# Altium footprint library Tomra_Cadstar_Footprints.PcbLib: 373 footprints (part 1 of 24)
Each footprint in its own frame and in the unit in brackets; x right, y up, seen from the top. Pads: shape width x height; smd on the part's side, far side on the other; paste and mask are expansions set on the pad; w line width, h text height; cw(c..) or ccw(c..) is an arc to the next point about the centre after c.
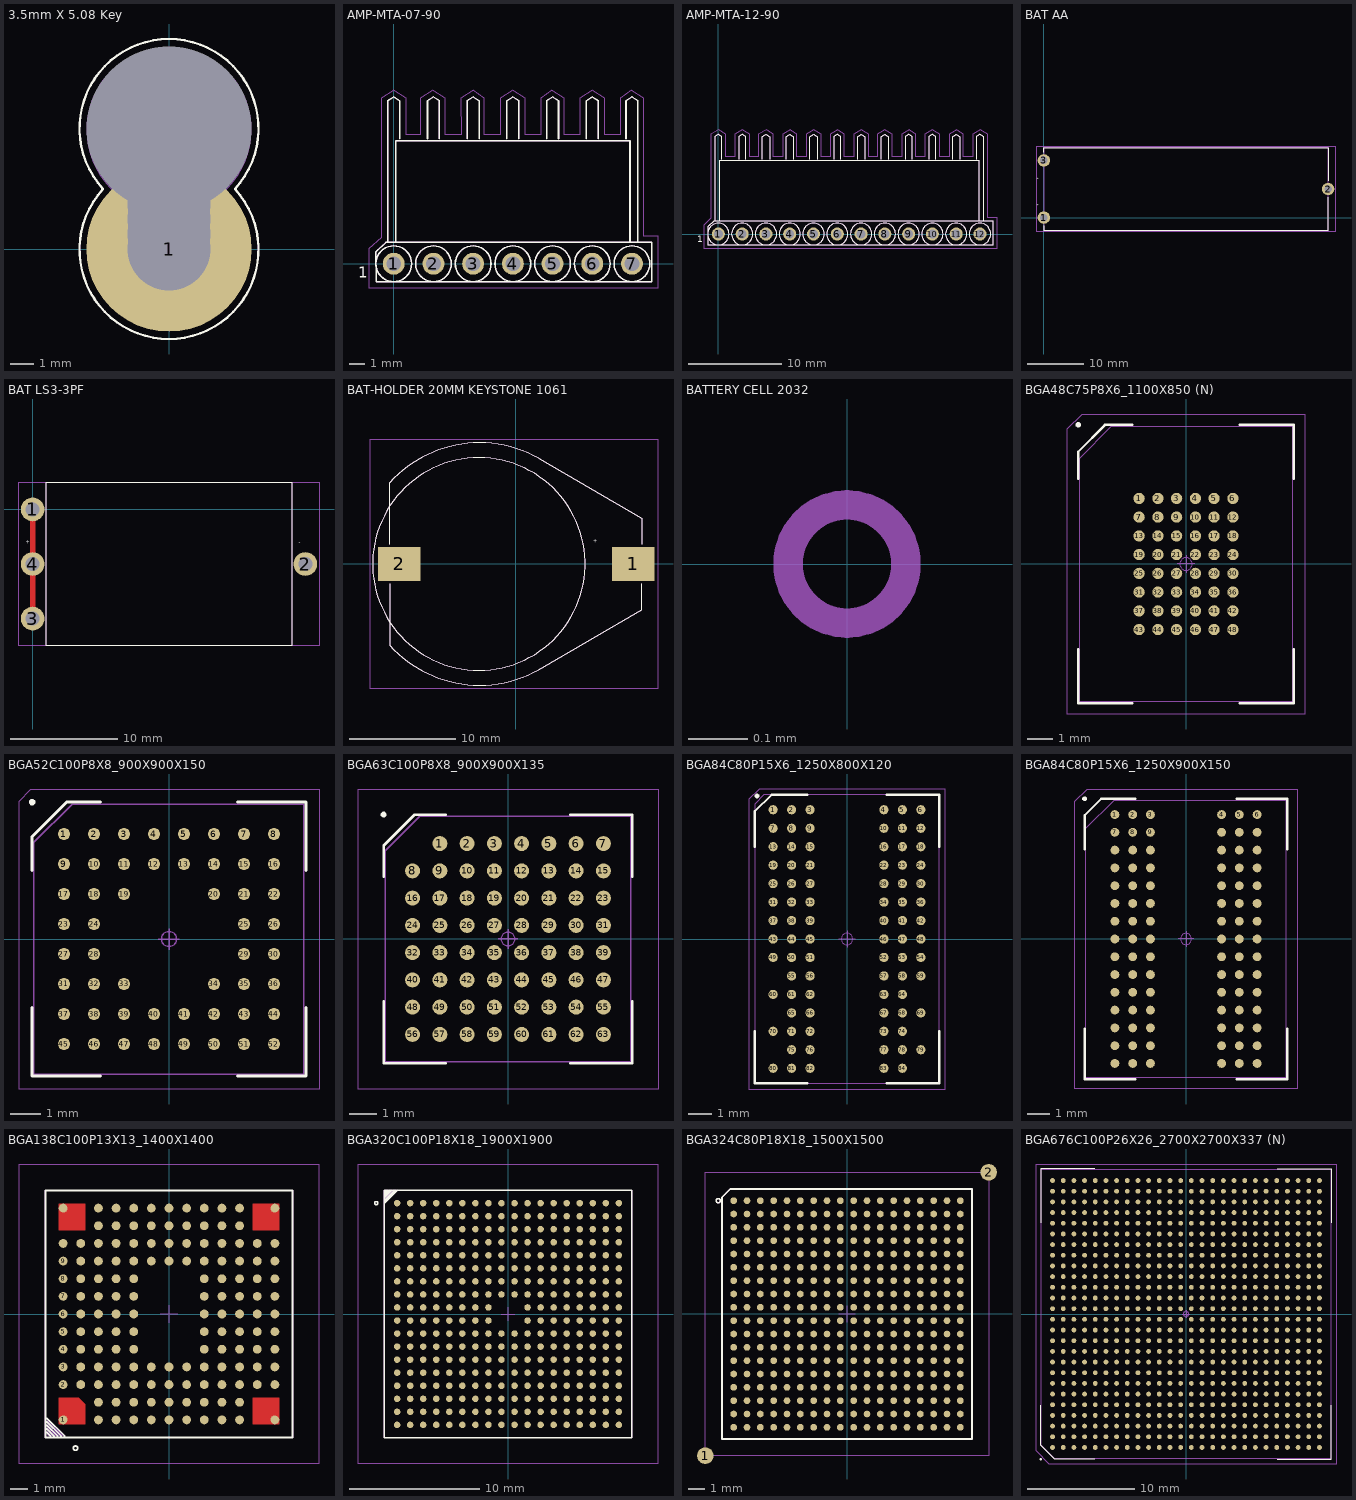
[diagram p0: the footprints below, top view; thin cyan lines are the x and y axes]

## 3.5mm X 5.08 Key [mm]
pads (5):
  round 7 / inner round 1.524 / far side round 7 hole 3.5 paste+0 mask+0: 1(0,0)
  round 0 / inner round 1.524 / far side round 0 hole 7 paste+0 mask+0: 2(0,5.08)
  round 0 / inner round 1.524 / far side round 0 hole 3.5 paste+0 mask+3.5: 3(0,0.635) 4(0,1.27) 5(0,1.905)
Top Silk:
  lines w0.1: -2.794,2.54 ccw(c0,-0.02) 2.794,2.54 ccw(c0,5.1) -2.794,2.54
Drill:
  lines w0.05: -1.778,0 ccw(c0,-0.018) 1.778,0 ; -1.778,0 ccw(c0,-0.018) 1.778,0 ; -1.778,0 -1.778,2.032 ; -1.778,0 -1.778,2.032 ; -1.778,2.032 cw(c0,5.031) 1.778,2.032 ; -1.778,2.032 cw(c0,5.031) 1.778,2.032 ; 1.778,0 1.778,2.032 ; 1.778,0 1.778,2.032
Top Assembly:
  text ".Designator" at 3.175,2.794 h0.7
Top Placement:
  lines w0.01: -2.794,2.54 ccw(c0,-0.02) 2.794,2.54

## AMP-MTA-07-90 [mm]
pads (7):
  round 1.4 / inner round 1.524 / far side round 1.4 hole 0.95 paste+0 mask+0: 1(0,0) 2(2.54,0) 3(5.08,0) 4(7.62,0) 5(10.16,0) 6(12.7,0) 7(15.24,0)
Top Silk:
  lines w0.1: 0.14,1.36 0.14,7.874 15.113,7.874 15.113,1.36 ; -0.381,10.414 0,10.668 ; -0.381,10.414 -0.381,1.397 -0.381,10.414 ; -0.381,10.414 0,10.668 ; 0,-1.143 ccw(c0,0) 0,1.143 ; 0,-1.143 cw(c0,0) 0,1.143 ; 0,-1.143 ccw(c0,0) 0,1.143 ; 0,-1.143 cw(c0,0) 0,1.143 ; 0,10.668 0.381,10.414 ; 0,10.668 0.381,10.414 ; 0.381,10.414 0.381,8.001 0.381,10.414 ; 2.159,10.414 2.54,10.668 ; 2.159,10.414 2.159,8.001 2.159,10.414 ; 2.159,10.414 2.54,10.668 ; 2.54,-1.143 ccw(c2.54,0) 2.54,1.143 ; 2.54,-1.143 cw(c2.54,0) 2.54,1.143 ; 2.54,-1.143 ccw(c2.54,0) 2.54,1.143 ; 2.54,-1.143 cw(c2.54,0) 2.54,1.143 ; 2.54,10.668 2.921,10.414 ; 2.54,10.668 2.921,10.414 ; 2.921,10.414 2.921,8.001 2.921,10.414 ; 4.699,10.414 4.699,8.001 4.699,10.414 ; 4.699,10.414 5.08,10.668 ; 4.699,10.414 5.08,10.668 ; 5.08,-1.143 ccw(c5.08,0) 5.08,1.143 ; 5.08,-1.143 cw(c5.08,0) 5.08,1.143 ; 5.08,-1.143 ccw(c5.08,0) 5.08,1.143 ; 5.08,-1.143 cw(c5.08,0) 5.08,1.143 ; 5.08,10.668 5.461,10.414 ; 5.08,10.668 5.461,10.414 ; 5.461,10.414 5.461,8.001 5.461,10.414 ; 7.239,10.414 7.239,8.001 7.239,10.414 ; 7.239,10.414 7.62,10.668 ; 7.239,10.414 7.62,10.668 ; 7.62,-1.143 ccw(c7.62,0) 7.62,1.143 ; 7.62,-1.143 cw(c7.62,0) 7.62,1.143 ; 7.62,-1.143 ccw(c7.62,0) 7.62,1.143 ; 7.62,-1.143 cw(c7.62,0) 7.62,1.143 ; 7.62,10.668 8.001,10.414 ; 7.62,10.668 8.001,10.414 ; 8.001,10.414 8.001,8.001 8.001,10.414 ; 9.779,10.414 9.779,8.001 9.779,10.414 ; 9.779,10.414 10.16,10.668 ; 9.779,10.414 10.16,10.668 ; 10.16,-1.143 ccw(c10.16,0) 10.16,1.143 ; 10.16,-1.143 cw(c10.16,0) 10.16,1.143 ; 10.16,-1.143 ccw(c10.16,0) 10.16,1.143 ; 10.16,-1.143 cw(c10.16,0) 10.16,1.143 ; 10.16,10.668 10.541,10.414 ; 10.16,10.668 10.541,10.414 ; 10.541,10.414 10.541,8.001 10.541,10.414 ; 12.319,10.414 12.7,10.668 ; 12.319,10.414 12.319,8.001 12.319,10.414 ; 12.319,10.414 12.7,10.668 ; 12.7,-1.143 ccw(c12.7,0) 12.7,1.143 ; 12.7,-1.143 cw(c12.7,0) 12.7,1.143 ; 12.7,-1.143 ccw(c12.7,0) 12.7,1.143 ; 12.7,-1.143 cw(c12.7,0) 12.7,1.143 ; 12.7,10.668 13.081,10.414 ; 12.7,10.668 13.081,10.414 ; 13.081,10.414 13.081,8.001 13.081,10.414 ; 14.859,10.414 15.24,10.668 ; 14.859,10.414 14.859,8.001 14.859,10.414 ; 14.859,10.414 15.24,10.668 ; 15.24,-1.143 ccw(c15.24,0) 15.24,1.143 ; 15.24,-1.143 cw(c15.24,0) 15.24,1.143 ; 15.24,-1.143 ccw(c15.24,0) 15.24,1.143 ; 15.24,-1.143 cw(c15.24,0) 15.24,1.143 ; 15.24,10.668 15.621,10.414 ; 15.24,10.668 15.621,10.414 ; 15.621,10.414 15.621,1.397 15.621,10.414 ; -1.143,0.762 -0.495,1.36 16.51,1.36 16.51,-1.143 -1.13,-1.143 -1.143,0.762
  text "1" at -2.286,-0.889 h0.7
  text ".Designator" at 0,0 h0.7
Top Assembly:
  lines w0.05: 0.14,1.36 0.14,7.874 15.113,7.874 15.113,1.36 ; -0.381,10.414 0,10.668 ; -0.381,10.414 -0.381,1.397 -0.381,10.414 ; -0.381,10.414 0,10.668 ; 0,-1.143 ccw(c0,0) 0,1.143 ; 0,-1.143 cw(c0,0) 0,1.143 ; 0,-1.143 ccw(c0,0) 0,1.143 ; 0,-1.143 cw(c0,0) 0,1.143 ; 0,10.668 0.381,10.414 ; 0,10.668 0.381,10.414 ; 0.381,10.414 0.381,8.001 0.381,10.414 ; 2.159,10.414 2.54,10.668 ; 2.159,10.414 2.159,8.001 2.159,10.414 ; 2.159,10.414 2.54,10.668 ; 2.54,-1.143 ccw(c2.54,0) 2.54,1.143 ; 2.54,-1.143 cw(c2.54,0) 2.54,1.143 ; 2.54,-1.143 ccw(c2.54,0) 2.54,1.143 ; 2.54,-1.143 cw(c2.54,0) 2.54,1.143 ; 2.54,10.668 2.921,10.414 ; 2.54,10.668 2.921,10.414 ; 2.921,10.414 2.921,8.001 2.921,10.414 ; 4.699,10.414 4.699,8.001 4.699,10.414 ; 4.699,10.414 5.08,10.668 ; 4.699,10.414 5.08,10.668 ; 5.08,-1.143 ccw(c5.08,0) 5.08,1.143 ; 5.08,-1.143 cw(c5.08,0) 5.08,1.143 ; 5.08,-1.143 ccw(c5.08,0) 5.08,1.143 ; 5.08,-1.143 cw(c5.08,0) 5.08,1.143 ; 5.08,10.668 5.461,10.414 ; 5.08,10.668 5.461,10.414 ; 5.461,10.414 5.461,8.001 5.461,10.414 ; 7.239,10.414 7.239,8.001 7.239,10.414 ; 7.239,10.414 7.62,10.668 ; 7.239,10.414 7.62,10.668 ; 7.62,-1.143 ccw(c7.62,0) 7.62,1.143 ; 7.62,-1.143 cw(c7.62,0) 7.62,1.143 ; 7.62,-1.143 ccw(c7.62,0) 7.62,1.143 ; 7.62,-1.143 cw(c7.62,0) 7.62,1.143 ; 7.62,10.668 8.001,10.414 ; 7.62,10.668 8.001,10.414 ; 8.001,10.414 8.001,8.001 8.001,10.414 ; 9.779,10.414 9.779,8.001 9.779,10.414 ; 9.779,10.414 10.16,10.668 ; 9.779,10.414 10.16,10.668 ; 10.16,-1.143 ccw(c10.16,0) 10.16,1.143 ; 10.16,-1.143 cw(c10.16,0) 10.16,1.143 ; 10.16,-1.143 ccw(c10.16,0) 10.16,1.143 ; 10.16,-1.143 cw(c10.16,0) 10.16,1.143 ; 10.16,10.668 10.541,10.414 ; 10.16,10.668 10.541,10.414 ; 10.541,10.414 10.541,8.001 10.541,10.414 ; 12.319,10.414 12.7,10.668 ; 12.319,10.414 12.319,8.001 12.319,10.414 ; 12.319,10.414 12.7,10.668 ; 12.7,-1.143 ccw(c12.7,0) 12.7,1.143 ; 12.7,-1.143 cw(c12.7,0) 12.7,1.143 ; 12.7,-1.143 ccw(c12.7,0) 12.7,1.143 ; 12.7,-1.143 cw(c12.7,0) 12.7,1.143 ; 12.7,10.668 13.081,10.414 ; 12.7,10.668 13.081,10.414 ; 13.081,10.414 13.081,8.001 13.081,10.414 ; 14.859,10.414 15.24,10.668 ; 14.859,10.414 14.859,8.001 14.859,10.414 ; 14.859,10.414 15.24,10.668 ; 15.24,-1.143 ccw(c15.24,0) 15.24,1.143 ; 15.24,-1.143 cw(c15.24,0) 15.24,1.143 ; 15.24,-1.143 ccw(c15.24,0) 15.24,1.143 ; 15.24,-1.143 cw(c15.24,0) 15.24,1.143 ; 15.24,10.668 15.621,10.414 ; 15.24,10.668 15.621,10.414 ; 15.621,10.414 15.621,1.397 15.621,10.414 ; -1.143,0.762 -0.495,1.36 16.51,1.36 16.51,-1.143 -1.13,-1.143 -1.143,0.762
  text "1" at -2.286,-0.889 h0.7
Top Placement:
  lines w0.01: -1.595,-1.54 -1.595,0.96 -0.795,1.66 -0.8,10.6 0,11.1 0.8,10.6 0.805,8.26 1.705,8.26 1.7,10.6 2.5,11.1 3.3,10.6 3.305,8.26 4.305,8.26 4.3,10.6 5.1,11.1 5.8,10.6 5.805,8.26 6.805,8.26 6.8,10.6 7.6,11.1 8.4,10.6 8.405,8.26 9.405,8.26 9.4,10.6 10.1,11.1 10.9,10.6 10.905,8.26 11.905,8.26 11.9,10.6 12.7,11.1 13.5,10.6 13.505,8.26 14.505,8.26 14.5,10.6 15.2,11.1 16,10.6 16.005,1.76 16.905,1.76 16.905,-1.54 -1.595,-1.54
  text "AMP MTA-100-7" at 1.8,1.4 h0.7
  text "1" at -2.286,-0.889 h0.7

## AMP-MTA-12-90 [mm]
pads (12):
  round 1.4 / inner round 1.524 / far side round 1.4 hole 0.95 paste+0 mask+0: 1(0,0) 2(2.54,0) 3(5.08,0) 4(7.62,0) 5(10.16,0) 6(12.7,0) 7(15.24,0) 8(17.78,0) 9(20.32,0) 10(22.86,0) 11(25.4,0) 12(27.94,0)
Top Silk:
  drawing of 160 lines, arcs and shapes, not listed
  text "1" at -2.286,-0.889 h0.7
  text ".Designator" at 0,0 h0.7
Top Assembly:
  drawing of 160 lines, arcs and shapes, not listed
  text "1" at -2.286,-0.889 h0.7
Top Placement:
  lines w0.01: -1.54,-1.54 -1.54,0.96 -0.84,1.66 -0.84,10.66 0.06,11.16 0.76,10.66 0.76,8.26 1.76,8.26 1.76,10.66 2.56,11.16 3.36,10.66 3.36,8.26 4.26,8.26 4.26,10.66 5.16,11.16 5.86,10.66 5.86,8.26 6.86,8.26 6.86,10.66 7.66,11.16 8.36,10.66 8.36,8.26 9.36,8.26 9.36,10.66 10.16,11.16 10.96,10.66 10.96,8.26 11.96,8.26 11.96,10.66 12.76,11.16 13.46,10.66 13.46,8.26 14.46,8.26 14.46,10.66 15.26,11.16 16.06,10.66 16.06,8.26 16.96,8.26 16.96,10.66 17.76,11.16 18.56,10.66 18.56,8.26 19.56,8.26 19.56,10.66 20.36,11.16 21.06,10.66 21.06,8.26 22.06,8.26 22.06,10.66 22.86,11.16 23.66,10.66 23.66,8.26 24.66,8.26 24.66,10.66 25.46,11.16 26.16,10.66 26.16,8.26 27.16,8.26 27.16,10.66 27.96,11.16 28.76,10.66 28.76,1.76 29.76,1.76 29.76,-1.54 -1.54,-1.54
  text "AMP MTA-100-12" at 7.76,1.36 h0.7
  text "1" at -2.286,-0.889 h0.7

## BAT AA [mm]
height 14.5
pads (3):
  round 2.2 / inner round 1.524 / far side round 2.2 hole 1.3 paste+0 mask+0: 1(0,0) 2(50.5,5.08) 3(0,10.16)
Top Silk:
  lines w0.1: 0,-1.42 0,-2.22 50.5,-2.22 50.5,3.58 ; 0,11.58 0,12.38 50.5,12.38 50.5,6.58
  text "+" at -1.25,2.08 h0.35
  text "+" at -1.25,6.83 h0.35
  text ".Designator" at 0.06,12.68 h0.7
Top Assembly:
  lines w0.05: 0,-2.22 50.5,-2.22 50.5,12.38 0,12.38 0,-2.22
  text "+" at -1.25,2.08 h0.35
  text "+" at -1.25,6.83 h0.35
  text "SIZE AA" at 44.226,-1.57 h0.7
Top Placement:
  lines w0.01: -1.4,-2.47 51.9,-2.47 51.9,12.63 -1.4,12.63 -1.4,-2.47

## BAT LS3-3PF [mm]
height 15
pads (4):
  round 2.2 / inner round 1.524 / far side round 2.2 hole 1.3 paste+0 mask+0: 1(0,0) 2(25.4,-5.08) 3(0,-10.16) 4(0,-5.08)
Top Elec:
  lines w0.5: 0,-10.16 0,-5.06 ; 0,-5.08 0,0
Top Silk:
  lines w0.1: 1.27,-12.7 1.27,2.54 24.13,2.54 24.13,-12.7 1.27,-12.7
  text "+" at -0.635,-3.175 h0.35
  text "-" at 24.765,-3.175 h0.35
  text ".Designator" at 1.27,3.175 h0.7
Top Assembly:
  lines w0.05: 1.27,-12.7 1.27,2.54 24.13,2.54 24.13,-12.7 1.27,-12.7
  text "+" at -0.635,-3.175 h0.35
  text "-" at 24.765,-3.175 h0.35
Top Placement:
  lines w0.01: -1.27,-12.7 -1.27,2.54 26.67,2.54 26.67,-12.7 -1.27,-12.7

## BAT-HOLDER 20MM KEYSTONE 1061 [mm]
height 6.5
pads (2):
  rrect0% 4x3.2 smd paste+0 mask+0.2: 1(11.05,0) 2(-10.95,0)
Top Silk:
  lines w0.1: -11.85,-1.85 -11.849,-7.653 ccw(c-3.38,0.045) -3.4,-11.4 ccw(c-3.375,-0.096) 2.2,-9.93 11.85,-4.3 11.85,-1.85 ; -11.85,1.85 -11.849,7.653 cw(c-3.38,-0.045) -3.4,11.4 cw(c-3.375,0.096) 2.2,9.93 11.85,4.3 11.85,1.85 ; -3.45,-10 cw(c-3.45,0) -3.45,10 cw(c-3.45,0) -3.45,-10
  text "+" at 7.3,2 h0.35
  text ".Designator" at 2.2,9.93 h0.7
Top Assembly:
  lines w0.05: -11.85,-1.85 -11.849,-7.653 ccw(c-3.38,0.045) -3.4,-11.4 ccw(c-3.375,-0.096) 2.2,-9.93 11.85,-4.3 11.85,-1.85 ; -11.85,1.85 -11.849,7.653 cw(c-3.38,-0.045) -3.4,11.4 cw(c-3.375,0.096) 2.2,9.93 11.85,4.3 11.85,1.85 ; -3.45,-10 cw(c-3.45,0) -3.45,10 cw(c-3.45,0) -3.45,-10
Top Placement:
  lines w0.01: -13.7,-11.7 13.4,-11.7 13.4,11.7 -13.7,11.7 -13.7,-11.7

## BATTERY CELL 2032 [mm]
height 3.2
Top Silk:
  text ".Designator" at 0,0 h0.7
Top Assembly:
  lines w0.05: 0,-0.1 cw(c0,0) 0,0.1 cw(c0,0) 0,-0.1

## BGA48C75P8X6_1100X850 (N) [mm]
height 1.2
pads (48):
  round 0.45 smd paste+0 mask+0: 1(-1.875,2.625) 2(-1.125,2.625) 3(-0.375,2.625) 4(0.375,2.625) 5(1.125,2.625) 6(1.875,2.625) 7(-1.875,1.875) 8(-1.125,1.875) 9(-0.375,1.875) 10(0.375,1.875) 11(1.125,1.875) 12(1.875,1.875) 13(-1.875,1.125) 14(-1.125,1.125) 15(-0.375,1.125) 16(0.375,1.125) 17(1.125,1.125) 18(1.875,1.125) 19(-1.875,0.375) 20(-1.125,0.375) 21(-0.375,0.375) 22(0.375,0.375) 23(1.125,0.375) 24(1.875,0.375) 25(-1.875,-0.375) 26(-1.125,-0.375) 27(-0.375,-0.375) 28(0.375,-0.375) 29(1.125,-0.375) 30(1.875,-0.375) 31(-1.875,-1.125) 32(-1.125,-1.125) 33(-0.375,-1.125) 34(0.375,-1.125) 35(1.125,-1.125) 36(1.875,-1.125) 37(-1.875,-1.875) 38(-1.125,-1.875) 39(-0.375,-1.875) 40(0.375,-1.875) 41(1.125,-1.875) 42(1.875,-1.875) 43(-1.875,-2.625) 44(-1.125,-2.625) 45(-0.375,-2.625) 46(0.375,-2.625) 47(1.125,-2.625) 48(1.875,-2.625)
Top Silk:
  region: -4.41,5.56 -4.41,5.601 -4.351,5.66 -4.269,5.66 -4.21,5.601 -4.21,5.56 -4.21,5.519 -4.269,5.46 -4.351,5.46 -4.41,5.519
  lines w0.1: -4.31,-3.405 -4.31,-5.56 -2.155,-5.56 ; -4.31,3.405 -4.31,4.49 -3.24,5.56 -2.155,5.56 ; 2.155,-5.56 4.31,-5.56 4.31,-3.405 ; 2.155,5.56 4.31,5.56 4.31,3.405
  text ".Designator" at -3.599,-0.35 h0.7
Top Assembly:
  lines w0.05: -4.25,-5.5 -4.25,4.23 -2.98,5.5 4.25,5.5 4.25,-5.5 -4.25,-5.5
Top Placement:
  lines w0.01: -4.75,-6 -4.75,5.4 -4.15,6 4.75,6 4.75,-6 -4.75,-6
  lines w0.05: -0.35,0 0.35,0 ; 0,-0.35 0,0.35 ; -0.25,0 cw(c0,0) 0.25,0 cw(c0,0) -0.25,0

## BGA52C100P8X8_900X900X150 [mm]
height 1.5
pads (52):
  round 0.4 smd paste+0 mask+0: 1(-3.5,3.5) 2(-2.5,3.5) 3(-1.5,3.5) 4(-0.5,3.5) 5(0.5,3.5) 6(1.5,3.5) 7(2.5,3.5) 8(3.5,3.5) 9(-3.5,2.5) 10(-2.5,2.5) 11(-1.5,2.5) 12(-0.5,2.5) 13(0.5,2.5) 14(1.5,2.5) 15(2.5,2.5) 16(3.5,2.5) 17(-3.5,1.5) 18(-2.5,1.5) 19(-1.5,1.5) 20(1.5,1.5) 21(2.5,1.5) 22(3.5,1.5) 23(-3.5,0.5) 24(-2.5,0.5) 25(2.5,0.5) 26(3.5,0.5) 27(-3.5,-0.5) 28(-2.5,-0.5) 29(2.5,-0.5) 30(3.5,-0.5) 31(-3.5,-1.5) 32(-2.5,-1.5) 33(-1.5,-1.5) 34(1.5,-1.5) 35(2.5,-1.5) 36(3.5,-1.5) 37(-3.5,-2.5) 38(-2.5,-2.5) 39(-1.5,-2.5) 40(-0.5,-2.5) 41(0.5,-2.5) 42(1.5,-2.5) 43(2.5,-2.5) 44(3.5,-2.5) 45(-3.5,-3.5) 46(-2.5,-3.5) 47(-1.5,-3.5) 48(-0.5,-3.5) 49(0.5,-3.5) 50(1.5,-3.5) 51(2.5,-3.5) 52(3.5,-3.5)
Top Silk:
  region: -4.66,4.56 -4.66,4.601 -4.601,4.66 -4.519,4.66 -4.46,4.601 -4.46,4.56 -4.46,4.519 -4.519,4.46 -4.601,4.46 -4.66,4.519
  lines w0.1: -4.56,-2.28 -4.56,-4.56 -2.28,-4.56 ; -4.56,2.28 -4.56,3.42 -3.42,4.56 -2.28,4.56 ; 2.28,-4.56 4.56,-4.56 4.56,-2.28 ; 2.28,4.56 4.56,4.56 4.56,2.28
  text ".Designator" at -3.599,-0.35 h0.7
Top Assembly:
  lines w0.05: -4.5,-4.5 -4.5,3.23 -3.23,4.5 4.5,4.5 4.5,-4.5 -4.5,-4.5
Top Placement:
  lines w0.01: -5,-5 -5,4.6 -4.6,5 5,5 5,-5 -5,-5
  lines w0.05: -0.35,0 0.35,0 ; 0,-0.35 0,0.35 ; -0.25,0 cw(c0,0) 0.25,0 cw(c0,0) -0.25,0

## BGA63C100P8X8_900X900X135 [mm]
height 1.35
pads (63):
  round 0.55 smd paste+0 mask+0: 1(-2.5,3.5) 2(-1.5,3.5) 3(-0.5,3.5) 4(0.5,3.5) 5(1.5,3.5) 6(2.5,3.5) 7(3.5,3.5) 8(-3.5,2.5) 9(-2.5,2.5) 10(-1.5,2.5) 11(-0.5,2.5) 12(0.5,2.5) 13(1.5,2.5) 14(2.5,2.5) 15(3.5,2.5) 16(-3.5,1.5) 17(-2.5,1.5) 18(-1.5,1.5) 19(-0.5,1.5) 20(0.5,1.5) 21(1.5,1.5) 22(2.5,1.5) 23(3.5,1.5) 24(-3.5,0.5) 25(-2.5,0.5) 26(-1.5,0.5) 27(-0.5,0.5) 28(0.5,0.5) 29(1.5,0.5) 30(2.5,0.5) 31(3.5,0.5) 32(-3.5,-0.5) 33(-2.5,-0.5) 34(-1.5,-0.5) 35(-0.5,-0.5) 36(0.5,-0.5) 37(1.5,-0.5) 38(2.5,-0.5) 39(3.5,-0.5) 40(-3.5,-1.5) 41(-2.5,-1.5) 42(-1.5,-1.5) 43(-0.5,-1.5) 44(0.5,-1.5) 45(1.5,-1.5) 46(2.5,-1.5) 47(3.5,-1.5) 48(-3.5,-2.5) 49(-2.5,-2.5) 50(-1.5,-2.5) 51(-0.5,-2.5) 52(0.5,-2.5) 53(1.5,-2.5) 54(2.5,-2.5) 55(3.5,-2.5) 56(-3.5,-3.5) 57(-2.5,-3.5) 58(-1.5,-3.5) 59(-0.5,-3.5) 60(0.5,-3.5) 61(1.5,-3.5) 62(2.5,-3.5) 63(3.5,-3.5)
Top Silk:
  region: -4.66,4.56 -4.66,4.601 -4.601,4.66 -4.519,4.66 -4.46,4.601 -4.46,4.56 -4.46,4.519 -4.519,4.46 -4.601,4.46 -4.66,4.519
  lines w0.1: -4.56,-2.28 -4.56,-4.56 -2.28,-4.56 ; -4.56,2.28 -4.56,3.42 -3.42,4.56 -2.28,4.56 ; 2.28,-4.56 4.56,-4.56 4.56,-2.28 ; 2.28,4.56 4.56,4.56 4.56,2.28
  text ".Designator" at -3.599,-0.35 h0.7
Top Assembly:
  lines w0.05: -4.5,-4.5 -4.5,3.23 -3.23,4.5 4.5,4.5 4.5,-4.5 -4.5,-4.5
Top Placement:
  lines w0.01: -5.5,-5.5 -5.5,5.5 5.5,5.5 5.5,-5.5 -5.5,-5.5
  lines w0.05: -0.35,0 0.35,0 ; 0,-0.35 0,0.35 ; -0.25,0 cw(c0,0) 0.25,0 cw(c0,0) -0.25,0

## BGA84C80P15X6_1250X800X120 [mm]
height 1.2
pads (84):
  round 0.4 smd paste+0 mask+0: 1(-3.2,5.6) 2(-2.4,5.6) 3(-1.6,5.6) 4(1.6,5.6) 5(2.4,5.6) 6(3.2,5.6) 7(-3.2,4.8) 8(-2.4,4.8) 9(-1.6,4.8) 10(1.6,4.8) 11(2.4,4.8) 12(3.2,4.8) 13(-3.2,4) 14(-2.4,4) 15(-1.6,4) 16(1.6,4) 17(2.4,4) 18(3.2,4) 19(-3.2,3.2) 20(-2.4,3.2) 21(-1.6,3.2) 22(1.6,3.2) 23(2.4,3.2) 24(3.2,3.2) 25(-3.2,2.4) 26(-2.4,2.4) 27(-1.6,2.4) 28(1.6,2.4) 29(2.4,2.4) 30(3.2,2.4) 31(-3.2,1.6) 32(-2.4,1.6) 33(-1.6,1.6) 34(1.6,1.6) 35(2.4,1.6) 36(3.2,1.6) 37(-3.2,0.8) 38(-2.4,0.8) 39(-1.6,0.8) 40(1.6,0.8) 41(2.4,0.8) 42(3.2,0.8) 43(-3.2,0) 44(-2.4,0) 45(-1.6,0) 46(1.6,0) 47(2.4,0) 48(3.2,0) 49(-3.2,-0.8) 50(-2.4,-0.8) 51(-1.6,-0.8) 52(1.6,-0.8) 53(2.4,-0.8) 54(3.2,-0.8) 55(-2.4,-1.6) 56(-1.6,-1.6) 57(1.6,-1.6) 58(2.4,-1.6) 59(3.2,-1.6) 60(-3.2,-2.4) 61(-2.4,-2.4) 62(-1.6,-2.4) 63(1.6,-2.4) 64(2.4,-2.4) 65(-2.4,-3.2) 66(-1.6,-3.2) 67(1.6,-3.2) 68(2.4,-3.2) 69(3.2,-3.2) 70(-3.2,-4) 71(-2.4,-4) 72(-1.6,-4) 73(1.6,-4) 74(2.4,-4) 75(-2.4,-4.8) 76(-1.6,-4.8) 77(1.6,-4.8) 78(2.4,-4.8) 79(3.2,-4.8) 80(-3.2,-5.6) 81(-2.4,-5.6) 82(-1.6,-5.6) 83(1.6,-5.6) 84(2.4,-5.6)
Top Silk:
  region: -4,6.2 -4,6.241 -3.941,6.3 -3.859,6.3 -3.8,6.241 -3.8,6.2 -3.8,6.159 -3.859,6.1 -3.941,6.1 -4,6.159
  lines w0.1: -4,-4 -4,-6.25 -1.72,-6.25 ; -4,4 -4,5.54 -3.26,6.25 -1.72,6.25 ; 1.72,-6.25 4,-6.25 4,-4 ; 1.72,6.25 4,6.25 4,4
  text ".Designator" at -3.599,-0.35 h0.7
Top Assembly:
  lines w0.05: -4,-6.25 4,-6.25 4,6.25 -3.6,6.25 -4,5.85 -4,-6.25
Top Placement:
  lines w0.01: -4.25,-6.5 4.25,-6.5 4.25,6.5 -3.8,6.5 -4.25,6.05 -4.25,-6.5
  lines w0.05: -0.35,0 0.35,0 ; 0,-0.35 0,0.35 ; -0.25,0 cw(c0,0) 0.25,0 cw(c0,0) -0.25,0

## BGA84C80P15X6_1250X900X150 [mm]
height 1.1
pads (90):
  round 0.4 smd paste+0 mask+0: 1(-3.2,5.6) 2(-2.4,5.6) 3(-1.6,5.6) 4(1.6,5.6) 5(2.4,5.6) 6(3.2,5.6) 7(-3.2,4.8) 8(-2.4,4.8) 9(-1.6,4.8) 10(1.6,4.8) 11(2.4,4.8) 12(3.2,4.8) 13(-3.2,4) 14(-2.4,4) 15(-1.6,4) 16(1.6,4) 17(2.4,4) 18(3.2,4) 19(-3.2,3.2) 20(-2.4,3.2) 21(-1.6,3.2) 22(1.6,3.2) 23(2.4,3.2) 24(3.2,3.2) 25(-3.2,2.4) 26(-2.4,2.4) 27(-1.6,2.4) 28(1.6,2.4) 29(2.4,2.4) 30(3.2,2.4) 31(-3.2,1.6) 32(-2.4,1.6) 33(-1.6,1.6) 34(1.6,1.6) 35(2.4,1.6) 36(3.2,1.6) 37(-3.2,0.8) 38(-2.4,0.8) 39(-1.6,0.8) 40(1.6,0.8) 41(2.4,0.8) 42(3.2,0.8) 43(-3.2,0) 44(-2.4,0) 45(-1.6,0) 46(1.6,0) 47(2.4,0) 48(3.2,0) 49(-3.2,-0.8) 50(-2.4,-0.8) 51(-1.6,-0.8) 52(1.6,-0.8) 53(2.4,-0.8) 54(3.2,-0.8) 55(-3.2,-1.6) 56(-2.4,-1.6) 57(-1.6,-1.6) 58(1.6,-1.6) 59(2.4,-1.6) 60(3.2,-1.6) 61(-3.2,-2.4) 62(-2.4,-2.4) 63(-1.6,-2.4) 64(1.6,-2.4) 65(2.4,-2.4) 66(3.2,-2.4) 67(-3.2,-3.2) 68(-2.4,-3.2) 69(-1.6,-3.2) 70(1.6,-3.2) 71(2.4,-3.2) 72(3.2,-3.2) 73(-3.2,-4) 74(-2.4,-4) 75(-1.6,-4) 76(1.6,-4) 77(2.4,-4) 78(3.2,-4) 79(-3.2,-4.8) 80(-2.4,-4.8) 81(-1.6,-4.8) 82(1.6,-4.8) 83(2.4,-4.8) 84(3.2,-4.8) 85(-3.2,-5.6) 86(-2.4,-5.6) 87(-1.6,-5.6) 88(1.6,-5.6) 89(2.4,-5.6) 90(3.2,-5.6)
Top Silk:
  region: -4.66,6.31 -4.66,6.351 -4.601,6.41 -4.519,6.41 -4.46,6.351 -4.46,6.31 -4.46,6.269 -4.519,6.21 -4.601,6.21 -4.66,6.269
  lines w0.1: -4.56,-4.03 -4.56,-6.31 -2.28,-6.31 ; -4.56,4.03 -4.56,5.57 -3.82,6.31 -2.28,6.31 ; 2.28,-6.31 4.56,-6.31 4.56,-4.03 ; 2.28,6.31 4.56,6.31 4.56,4.03
  text ".Designator" at -3.599,-0.35 h0.7
Top Assembly:
  lines w0.05: -4.5,-6.25 -4.5,4.98 -3.23,6.25 4.5,6.25 4.5,-6.25 -4.5,-6.25
Top Placement:
  lines w0.01: -5,-6.75 -5,6.2 -4.45,6.75 5,6.75 5,-6.75 -5,-6.75
  lines w0.05: -0.35,0 0.35,0 ; 0,-0.35 0,0.35 ; -0.25,0 cw(c0,0) 0.25,0 cw(c0,0) -0.25,0
